# Altium footprint library passives_ITS_v1.PcbLib: 43 footprints (part 2 of 3)
Each footprint in its own frame and in the unit in brackets; x right, y up, seen from the top. Pads: shape width x height; smd on the part's side, far side on the other; paste and mask are expansions set on the pad; w line width, h text height; cw(c..) or ccw(c..) is an arc to the next point about the centre after c.
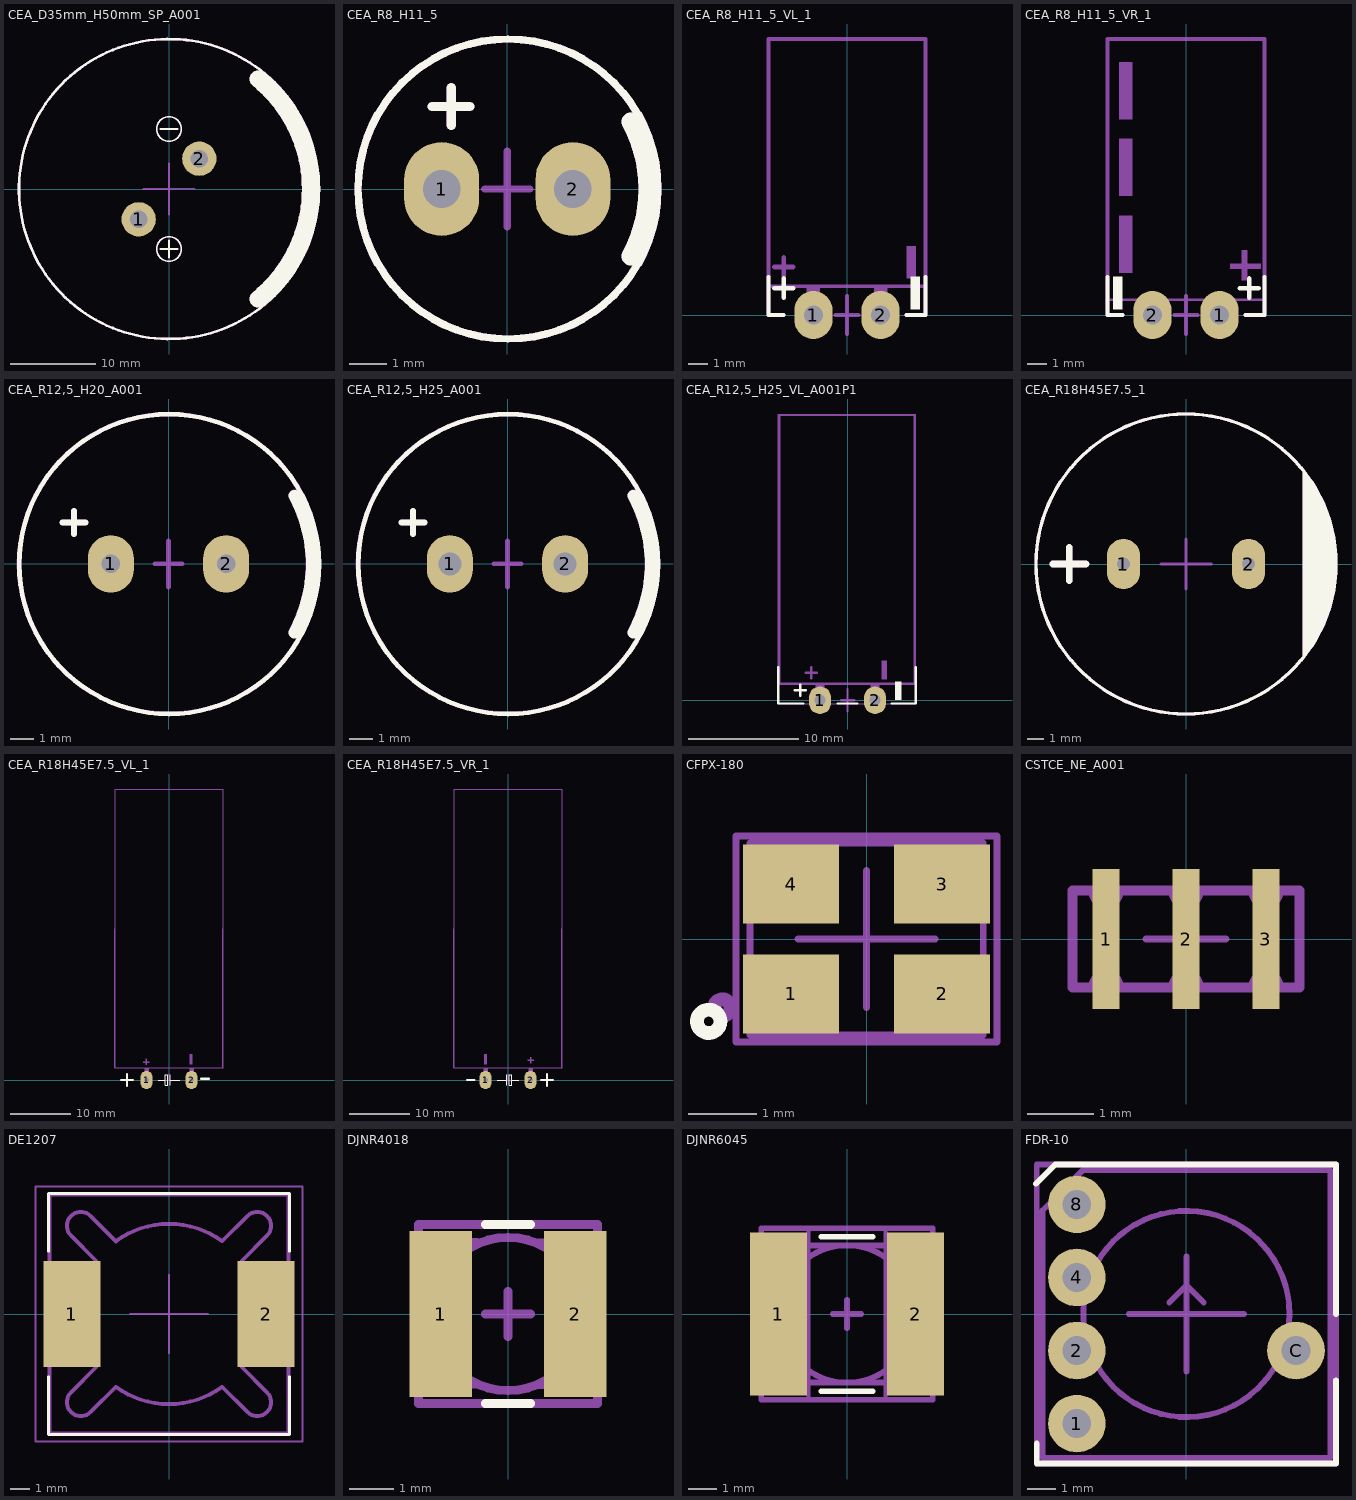
[diagram p1: the footprints below, top view; thin cyan lines are the x and y axes]

## CEA_D35mm_H50mm_SP_A001 [mm]
pads (2):
  round 4 hole 2 paste-1: 1(-3.535,-3.535) 2(3.535,3.535)
Top Overlay:
  circle w0.3: c0,0 r17.5
  circle w0.2: c0,-7 r1.442
  circle w0.2: c0,7 r1.442
  lines w0.2: -1,-7 0,-7 ; -1,7 0,7 1,7 ; 0,-8 0,-7 ; 0,-6 0,-7 ; 1,-7 0,-7
  lines w2: 10.376,-12.829 ccw(c0,0) 10.376,12.829
M15_Orgin:
  lines w0.2: -2.994,-0.002 0.006,-0.002 ; 0,0 0,3 ; 0.006,-2.993 0.006,0.007 ; 0.006,0.015 3.006,0.015
Top M17-18_TDES:
  text "'.Designator'" at -11.33,-0.833 h2
Top M19-20_TMOT:
  circle w0.3: c0,0 r17.5
  circle w0.2: c0,7 r1.442
  circle w0.2: c0,-7 r1.442
  lines w0.2: -1,-7 0,-7 ; -1,7 0,7 1,7 ; 0,-8 0,-7 ; 0,-6 0,-7 ; 1,-7 0,-7
  lines w2: 10.376,-12.829 ccw(c0,0) 10.376,12.829
3D body "Capacitor_SnapIn_35x50mm.STEP": height 51.57, standoff -4.61, extent -17.78,-17.78 17.78,17.78

## CEA_R8_H11_5 [mm] "snap 3.5mm fi 8mm h 11.5mm"
pads (2):
  oval 2x2.5 hole 1: 1(-1.75,0) 2(1.75,0)
Top Overlay:
  circle w0.2: c0.018,0 r4
  lines w0.25: -2,2.2 -1,2.2 ; -1.5,1.7 -1.5,2.7
  lines w0.5: 3.292,-1.796 ccw(c0,0) 3.292,1.796
M15_Orgin:
  lines w0.2: -0.6,0 0.6,0 ; 0,-1 0,1
Top M17-18_TDES:
  text "'.Designator'" at 0.417,-5.665 h1
Top M19-20_TMOT:
  circle w0.2: c0.018,0 r4
  lines w0.25: -2,2.2 -1,2.2 ; -1.5,1.7 -1.5,2.7
  lines w0.5: 3.292,-1.796 ccw(c0,0) 3.292,1.796
3D body "CE_R150_D320_H570.step": height 14.41, standoff -2.89, extent -4.1,-4.1 4.1,4.1

## CEA_R8_H11_5_VL_1 [mm] "snap 3.5mm fi 8mm h 11.5mm"
pads (2):
  oval 2x2.5 hole 1: 1(-1.75,0) 2(1.75,0)
Top Overlay:
  rectangle: 3.3,0.3 3.8,2
  lines w0.2: -4.1,2 -4.1,0 -3.3,0 ; 3.1,0 4.1,0 4.1,2
  lines w0.25: -3.8,1.4 -2.8,1.4 ; -3.3,0.9 -3.3,1.9
M15_Orgin:
  lines w0.2: -3.3,0 -4.1,0 -4.1,14.4 4.1,14.4 4.1,0 3.1,0 ; -0.6,0 0.6,0 ; 0,-1 0,1
Top M17-18_TDES:
  text "'.Designator'" at -5.665,-2.517 h1
Top M19-20_TMOT:
  rectangle: 1.406,0.6 2.106,1.5
  rectangle: -2.1,0.6 -1.4,1.5
  rectangle: 3.1,1.9 3.6,3.6
  lines w0.1: -2.3,-0.5 -1.2,0.6 ; -2.3,-0.5 -2.3,0.6 ; -2.3,-0.5 -1.2,-0.5 ; -2.3,0.6 -1.2,-0.5 ; -2.3,0.6 -1.2,0.6 ; -1.2,-0.5 -1.2,0.6 ; 1.206,-0.5 2.306,0.6 ; 1.206,-0.5 1.206,0.6 ; 1.206,-0.5 2.306,-0.5 ; 1.206,0.6 2.306,-0.5 ; 1.206,0.6 2.306,0.6 ; 2.306,-0.5 2.306,0.6
  lines w0.2: -4.1,1.5 -4.1,14.4 4.1,14.4 4.1,1.5 -4.1,1.5
  lines w0.25: -3.8,2.5 -2.8,2.5 ; -3.3,2 -3.3,3
3D body "CE_R150_D320_H570.step": height 10.1, standoff 1.9, extent -4.1,-2.9 4.1,14.4

## CEA_R8_H11_5_VR_1 [mm] "snap 3.5mm fi 8mm h 11.5mm"
pads (2):
  oval 2x2.5 hole 1: 1(1.75,0) 2(-1.75,0)
Top Overlay:
  rectangle: -3.8,0.3 -3.3,2
  lines w0.2: -4.1,2 -4.1,0 -3.3,0 ; 3.1,0 4.1,0 4.1,2
  lines w0.25: 2.8,1.4 3.8,1.4 ; 3.3,0.9 3.3,1.9
M15_Orgin:
  lines w0.2: -3.3,0 -4.1,0 -4.1,14.4 4.1,14.4 4.1,0 3.1,0 ; -0.6,0 0.6,0 ; 0,-1 0,1
Top M17-18_TDES:
  text "'.Designator'" at 0.117,1.735 h1
Top M19-20_TMOT:
  circle w0.4: c1.8,0 r0.2
  circle w0.4: c-1.743,0.031 r0.2
  rectangle: -3.5,6.2 -2.8,9.2
  rectangle: 2.9,1.8 3.2,3.4
  rectangle: -3.5,10.2 -2.8,13.2
  rectangle: -3.5,2.2 -2.8,5.2
  region: 3.9,2.4 3.9,2.7 2.3,2.7 2.3,2.4
  lines w0.15: -4.1,0.8 4.1,0.8 4.1,14.4 -4.1,14.4 -4.1,0.8
3D body "CE_R150_D320_H570.step": height 8.3, standoff 0.1, extent -4.1,-2.9 4.1,14.4

## CEA_R12,5_H20_A001 [mm] "e=5mm fi 12,5mm h 20mm"
pads (2):
  oval 2x2.5 hole 0.8: 1(-2.5,0) 2(2.5,0)
Top Overlay:
  circle w0.2: c0.024,-0.008 r6.5
  lines w0.25: -4.594,1.792 -3.594,1.792 ; -4.094,1.292 -4.094,2.292
  lines w0.5: 5.449,-2.976 ccw(c0.006,-0.008) 5.449,2.961
M15_Orgin:
  lines w0.2: -0.6,0 0.6,0 ; 0,-1 0,1
Top M17-18_TDES:
  text "'.Designator'" at -5.665,-2.717 h1
Top M19-20_TMOT:
  circle w0.2: c0.018,0 r6.5
  lines w0.25: -4.6,1.8 -3.6,1.8 ; -4.1,1.3 -4.1,2.3
  lines w0.5: 5.443,-2.969 ccw(c0,0) 5.443,2.969
3D body "Cap_EL_fi12_5_h20_e5.STEP": height 20.01, standoff -1.99, extent -6.25,-6.25 6.25,6.25

## CEA_R12,5_H25_A001 [mm] "e=5mm fi 12,5mm h 25mm"
pads (2):
  oval 2x2.5 hole 1: 1(-2.5,0) 2(2.5,0)
Top Overlay:
  circle w0.2: c0.024,-0.008 r6.5
  lines w0.25: -4.594,1.792 -3.594,1.792 ; -4.094,1.292 -4.094,2.292
  lines w0.5: 5.449,-2.976 ccw(c0.006,-0.008) 5.449,2.961
M15_Orgin:
  lines w0.2: -0.6,0 0.6,0 ; 0,-1 0,1
Top M17-18_TDES:
  text "'.Designator'" at -5.665,-2.717 h1
Top M19-20_TMOT:
  circle w0.2: c0.018,0 r6.5
  lines w0.25: -4.6,1.8 -3.6,1.8 ; -4.1,1.3 -4.1,2.3
  lines w0.5: 5.443,-2.969 ccw(c0,0) 5.443,2.969
3D body "R12_5H25_v1.STEP": height 25.01, standoff -2.99, extent -6.25,-6.25 6.25,6.25

## CEA_R12,5_H25_VL_A001P1 [mm] "e=5mm fi 12,5mm h 25mm"
pads (2):
  oval 2x2.5 hole 1: 1(-2.5,0) 2(2.5,0)
Top Overlay:
  rectangle: 4.3,0 4.9,1.7
  lines w0.2: -6.3,3 -6.3,-0.3 -4,-0.3 ; -0.9,-0.3 0.9,-0.3 ; 4,-0.3 6.2,-0.3 6.2,3
  lines w0.25: -4.8,0.9 -3.8,0.9 ; -4.3,0.4 -4.3,1.4
M15_Orgin:
  lines w0.1: -6.3,-0.3 6.2,-0.3 6.2,26 -6.3,26 -6.3,-0.3
  lines w0.2: -0.6,0 0.6,0 ; 0,-1 0,1
Top M17-18_TDES:
  text "'.Designator'" at -5.665,-2.417 h1
Top M19-20_TMOT:
  rectangle: 3.1,1.9 3.6,3.6
  rectangle: -2.9,0.55 -2.1,1.5
  rectangle: 2.1,0.55 2.9,1.5
  lines w0.1: -3.05,-0.55 -1.95,-0.55 ; -3.05,-0.55 -3.05,0.55 ; -3.05,-0.55 -1.95,0.55 ; -3.05,0.55 -1.95,0.55 ; -3.05,0.55 -1.95,-0.55 ; -1.95,-0.55 -1.95,0.55 ; 1.95,-0.55 3.05,-0.55 ; 1.95,-0.55 1.95,0.55 ; 1.95,-0.55 3.05,0.55 ; 1.95,0.55 3.05,0.55 ; 1.95,0.55 3.05,-0.55 ; 3.05,-0.55 3.05,0.55
  lines w0.2: -6.2,1.5 6.1,1.5 6.1,25.9 -6.2,25.9 -6.2,1.5
  lines w0.25: -3.8,2.5 -2.8,2.5 ; -3.3,2 -3.3,3
3D body "R12_5H25_v1_VL.STEP": height 12.75, standoff -2.75, extent -6.3,-0.3 6.2,26

## CEA_R18H45E7.5_1 [mm]
pads (2):
  oval 2x3 hole 0.8 mask+0.1: 1(-3.75,0) 2(3.75,0)
Top Overlay:
  circle w0.2: c0,0 r9
  region: 7,-5.6 8,-4.2 8.6,-2.7 9,-0.8 9,0.6 8.7,2.4 8,4.1 7,5.6
  lines w0.4: -8,0 -6,0 ; -7,-1 -7,1
M15_Orgin:
  lines w0.2: -1.5,0 0,0 ; 0,-1.5 0,0 ; 0,1.5 0,0 ; 0.017,-0.005 1.517,-0.005
Top M17-18_TDES:
  text "'.Designator'" at -7.931,-3.983 h1.4
Top M19-20_TMOT:
  circle w0.2: c0,0 r9
  region: 7,-5.6 8,-4.2 8.6,-2.7 9,-0.8 9,0.6 8.7,2.4 8,4.1 7,5.6
  lines w0.4: -8,0 -6,0 ; -7,-1 -7,1
3D body "CAPAER_D180_L465_P075_W008X030.STEP": height 46.51, standoff -3, extent -9,-9 9.01,9

## CEA_R18H45E7.5_VL_1 [mm] "vertival left"
pads (2):
  oval 2x3 hole 0.8 mask+0.1: 1(-3.75,0) 2(3.75,0)
Top Overlay:
  lines w0.2: -1.8,0 -0.6,0 ; 0.2,-0.9 0.2,0.9 ; 0.2,0 1.8,0 ; -0.6,-0.9 -0.2,-0.9 -0.2,0.9 -0.6,0.9 -0.6,-0.9
  lines w0.4: -8,0 -6,0 ; -7,-1 -7,1 ; 5.4,0.2 6.6,0.2
M15_Orgin:
  lines w0.1: -4,2 -4,1.2 -3.5,1.2 -3.5,2 ; -1,0 1,0 ; 0,0 0,1 ; 3.5,2 3.5,1.2 4,1.2 4,2 ; -9,2 9,2 9,48.5 -9,48.5 -9,2
Top M17-18_TDES:
  text "'.Designator'" at -7.931,5.467 h1.4
Top M19-20_TMOT:
  rectangle: 3.4,2.6 3.9,4.3
  rectangle: -4.1,0.55 -3.3,2
  rectangle: 3.4,0.55 4.2,2
  lines w0.1: -4.25,-0.55 -3.15,-0.55 ; -4.25,-0.55 -4.25,0.55 ; -4.25,-0.55 -3.15,0.55 ; -4.25,0.55 -3.15,0.55 ; -4.25,0.55 -3.15,-0.55 ; -3.15,-0.55 -3.15,0.55 ; 3.25,-0.55 4.35,-0.55 ; 3.25,-0.55 3.25,0.55 ; 3.25,-0.55 4.35,0.55 ; 3.25,0.55 4.35,0.55 ; 3.25,0.55 4.35,-0.55 ; 4.35,-0.55 4.35,0.55
  lines w0.2: -9,2 9,2 9,48.5 -9,48.5 -9,2
  lines w0.25: -4.3,3 -3.3,3 ; -3.8,2.5 -3.8,3.5
3D body "CAPAER_D180_L465_P075_W008X030.STEP": height 18, standoff 0, extent -9,-1 9.01,48.514

## CEA_R18H45E7.5_VR_1 [mm] "vertival right"
pads (2):
  oval 2x3 hole 0.8 mask+0.1: 1(-3.75,0) 2(3.75,0)
Top Overlay:
  lines w0.2: -1.8,0 -0.2,0 ; -0.2,-0.9 -0.2,0.9 ; 0.6,0 1.8,0 ; 0.2,-0.9 0.2,0.9 0.6,0.9 0.6,-0.9 0.2,-0.9
  lines w0.4: -6.8,0 -5.6,0 ; 5.5,0 7.5,0 ; 6.5,-1 6.5,1
M15_Orgin:
  lines w0.1: -4,2 -4,1.2 -3.5,1.2 -3.5,2 ; -1,0 1,0 ; 0,0 0,1 ; 3.5,2 3.5,1.2 4,1.2 4,2 ; -9,2 -9,48.5 9,48.5 9,2 -9,2
Top M17-18_TDES:
  text "'.Designator'" at -7.931,5.467 h1.4
Top M19-20_TMOT:
  rectangle: -4,2.6 -3.5,4.3
  rectangle: -4.1,0.55 -3.3,2
  rectangle: 3.4,0.55 4.2,2
  lines w0.1: -4.25,-0.55 -3.15,-0.55 ; -4.25,-0.55 -4.25,0.55 ; -4.25,-0.55 -3.15,0.55 ; -4.25,0.55 -3.15,0.55 ; -4.25,0.55 -3.15,-0.55 ; -3.15,-0.55 -3.15,0.55 ; 3.25,-0.55 4.35,-0.55 ; 3.25,-0.55 3.25,0.55 ; 3.25,-0.55 4.35,0.55 ; 3.25,0.55 4.35,0.55 ; 3.25,0.55 4.35,-0.55 ; 4.35,-0.55 4.35,0.55
  lines w0.2: -9,2 9,2 9,48.5 -9,48.5 -9,2
  lines w0.25: 3.3,3.3 4.3,3.3 ; 3.8,2.8 3.8,3.8
3D body "CAPAER_D180_L465_P075_W008X030.STEP": height 18, standoff 0, extent -9.01,-1 9,48.514

## CFPX-180 [mm] "kwarc"
pads (4):
  rect 1.4x1.15 smd: 1(-1.1,-0.8) 2(1.1,-0.8) 3(1.1,0.8) 4(-1.1,0.8)
Top Overlay:
  circle w0.2: c-2.3,-1.2 r0.17
Top M11-12_SMOT:
  circle w0.2: c-2.1,-1 r0.12
  rectangle: 0.7,0.5 1.7,1.4
  region: 1.7,-0.5 0.7,-0.5 0.7,-1.4 1.7,-1.4
  rectangle: -1.7,0.5 -0.7,1.4
  region: -0.7,-0.5 -1.7,-0.5 -1.7,-1.4 -0.7,-1.4
  lines w0.1: -1.7,-1.4 1.7,-1.4 1.7,1.4 -1.7,1.4 -1.7,-1.4
Top M13-14_SDES:
  text "'.Designator'" at -4.532,1.967 h0.8
M15_Orgin:
  lines w0.1: -1,0 0,0 ; 0,-1 0,0 ; 0,1 0,0 ; 1,0 0,0 ; -1.9,-1.5 1.9,-1.5 1.9,1.5 -1.9,1.5 -1.9,-1.5
3D body: height 0.6, standoff 0, extent -1.7,-1.4 1.7,1.4
3D body: height 0.8, standoff 0.6, extent -1.6,-1.3 1.6,1.3

## CSTCE_NE_A001 [mm] "Murata ceramic resonator e=1,2mm"
pads (3):
  rect 0.4x2.1 smd: 1(-1.2,0) 2(0,0) 3(1.2,0)
Top M11-12_SMOT:
  lines w0.1: -1.409,-0.689 cw(c-1.2,-0.71) -0.991,-0.69 ; -1.409,0.69 ccw(c-1.2,0.71) -0.991,0.689 ; -0.209,-0.689 cw(c0,-0.71) 0.209,-0.69 ; -0.209,0.69 ccw(c0,0.71) 0.209,0.689 ; 0.991,-0.689 cw(c1.2,-0.71) 1.409,-0.69 ; 0.991,0.69 ccw(c1.2,0.71) 1.409,0.689
  lines w0.15: -1.7,0.71 -1.7,-0.73 1.7,-0.73 1.7,0.73 -1.7,0.73
Top M13-14_SDES:
  text "'.Designator'" at -3.399,-0.25 h0.6
M15_Orgin:
  lines w0.05: -1.7,0.71 -1.7,-0.73 1.7,-0.73 1.7,0.73 -1.7,0.73
  lines w0.1: -0.6,0 0,0 ; 0,-0.6 0,0 ; 0,0.6 0,0 ; 0.6,0 0,0
3D body: height 0.7, standoff 0.4, extent -1.5,-0.5 1.5,0.5
3D body: height 0.4, standoff 0, extent -1.7,-0.7 1.7,0.7

## DE1207 [mm]
pads (2):
  rect 2.9x5.4 smd: 1(-4.95,0) 2(4.95,0)
Top Overlay:
  lines w0.152: -6.15,-3.2 -6.15,-6.15 6.15,-6.15 6.15,-3.2 ; -6.15,3.2 -6.15,6.15 6.15,6.15 6.15,3.2
Top M11-12_SMOT:
  rectangle: 5.1,-2.5 6.1,2.5
  region: -5.1,2.5 -6.1,2.5 -6.1,-2.5 -5.1,-2.5
  lines w0.1: -3.716,2.712 -3.7,2.696
  lines w0.2: -3.716,-2.712 cw(c0,0) -3.716,2.712 -3.716,2.716 -5,4 cw(c-4.5,4.5) -4,5 -2.7,3.7 ; -3.714,-2.714 -5,-4 ccw(c-4.5,-4.5) -4,-5 -2.714,-3.714 ; -2.712,-3.716 ccw(c0,0) 2.712,-3.716 ; -2.712,3.716 cw(c0,0) 2.712,3.716 ; 2.714,-3.714 4,-5 ccw(c4.5,-4.5) 5,-4 3.714,-2.714 ; 2.714,3.714 4,5 cw(c4.5,4.5) 5,4 3.714,2.714 ; 3.716,-2.712 ccw(c0,0) 3.716,2.712 ; -6.1,-6.1 6.1,-6.1 6.1,6.1 -6.1,6.1 -6.1,-6.1
Top M13-14_SDES:
  text "'.Designator'" at 0.5,-6.798 h1.2
M15_Orgin:
  lines w0.1: -2,0 0,0 ; 0,-2 0,0 ; 0,2 0,0 ; 2,0 0,0 ; -6.8,-6.5 6.8,-6.5 6.8,2.3 6.8,6.5 -6.8,6.5 -6.8,-6.5
3D body "DE1207.STEP": height 8, standoff 0, extent -6.077,-6.15 6.223,6.15

## DJNR4018 [mm]
pads (2):
  rect 1.4x3.7 smd mask+0: 1(-1.5,0) 2(1.5,0)
Top Overlay:
  lines w0.2: -0.5,-2 0.5,-2 ; -0.5,2 0.5,2
Top M11-12_SMOT:
  circle w0.2: c0,0 r1.709
  lines w0.2: -0.7,-1.559 -1.9,-1.559 -1.9,1.6 -0.7,1.6 ; 0.69,-1.571 1.89,-1.571 1.89,1.587 0.69,1.587
Top M13-14_SDES:
  text "'.Designator'" at 0.333,-4.532 h0.8
M15_Orgin:
  lines w0.2: -0.5,0 0.5,0 ; 0,-0.5 0,0.5 ; -2,-2 -2,2 2,2 2,-2 -2,-2
3D body: height 19.25, standoff -0.25, extent 0,0 0,0
3D body: height 0.3, standoff 0, extent -2,-1.6 -1.4,1.6
3D body: height 0.3, standoff 0, extent 1.4,-1.6 2,1.6
3D body: height 1.8, standoff 1.5, extent -2,-2 2,2
3D body: height 1.8, standoff 0.3, extent -1.394,-1.397 1.395,1.397
3D body: height 0.3, standoff 0, extent -1.4,-1.8 1.4,1.8

## DJNR6045 [mm]
pads (2):
  rect 2x5.7 smd mask+0: 1(-2.4,0) 2(2.4,0)
Top Overlay:
  lines w0.2: -0.9,-2.7 0.9,-2.7 ; -0.9,2.7 0.9,2.7
Bottom M13-14_SDES:
  text "'.Designator'" at -4.532,-0.333 h0.8
M15_Orgin:
  lines w0.15: -1.35,-3 -1.35,3 ; 1.35,-3 1.35,3
  lines w0.2: -0.5,0 0.5,0 ; 0,-0.5 0,0.5 ; -3,-3 -3,3 3,3 3,-3 -3,-3
Mechanical 16:
  circle w0.2: c0,0 r2.4
  lines w0.2: -2.9,-2.4 2.9,-2.4 2.9,2.4 -2.9,2.4 -2.9,-2.4
3D body: height 4.5, standoff 4, extent -2.805,-2.797 2.795,2.797
3D body: height 4, standoff 0.5, extent -2.005,-2 1.995,2
3D body: height 19.25, standoff -0.25, extent 0,0 0,0
3D body: height 0.55, standoff 0, extent 1.9,-2.5 2.8,2.5
3D body: height 0.5, standoff 0, extent -2.81,-2.8 2.8,2.8
3D body: height 0.55, standoff 0, extent -2.81,-2.5 -1.91,2.5

## FDR-10 [mm] "rotary dip switch"
pads (5):
  round 2 hole 1 paste+0 mask+0.05: 1(-3.81,-3.81) 2(-3.81,-1.27) 4(-3.81,1.27) 8(-3.81,3.81) C(3.81,-1.27)
Top Overlay:
  lines w0.2: -5.228,4.528 -4.557,5.2 5.2,5.2 5.2,0 ; -5.2,-4.5 -5.2,-5.2 5.2,-5.2 5.2,-2.3
M15_Orgin:
  lines w0.2: -2,0 0,0 ; 0,-2 0,0 ; 0,2 0,0 ; 2,0 0,0 ; -5.2,-5.2 -5.2,5.2 5.2,5.2 5.2,-5.2 -5.2,-5.2
Top M17-18_TDES:
  text "'.Designator'" at 0.417,-5.665 h1
Top M19-20_TMOT:
  circle w0.2: c0,0 r3.585
  lines w0.2: 0,-0.9 0,1 ; 0.6,0.4 0,1 ; -0.6,0.4 -0.6,0.4 ; -0.6,0.4 0,1 ; -5,-5 -5,3.6 -3.6,5 5,5 5,-5 -5,-5
  text "9" at -1.561,1.28 h1.2
  text "8" at -1.953,0.034 h1.2
  text "7" at -1.706,-0.795 h1.2
  text "6" at -0.824,-1.75 h1.2
  text "5" at 0.4,-1.9 h1.2
  text "4" at 1.471,-1.28 h1.2
  text "3" at 1.853,-0.334 h1.2
  text "2" at 1.706,1.095 h1.2
  text "1" at 0.886,1.732 h1.2
  text "0" at 0.3,3.1 h1.2
3D body "FDR-10.STEP": height 6.61, standoff -3.79, extent -5,-5 5,5